# Altium integrated library CbyP.IntLib: 1144 symbols (part 4 of 6)
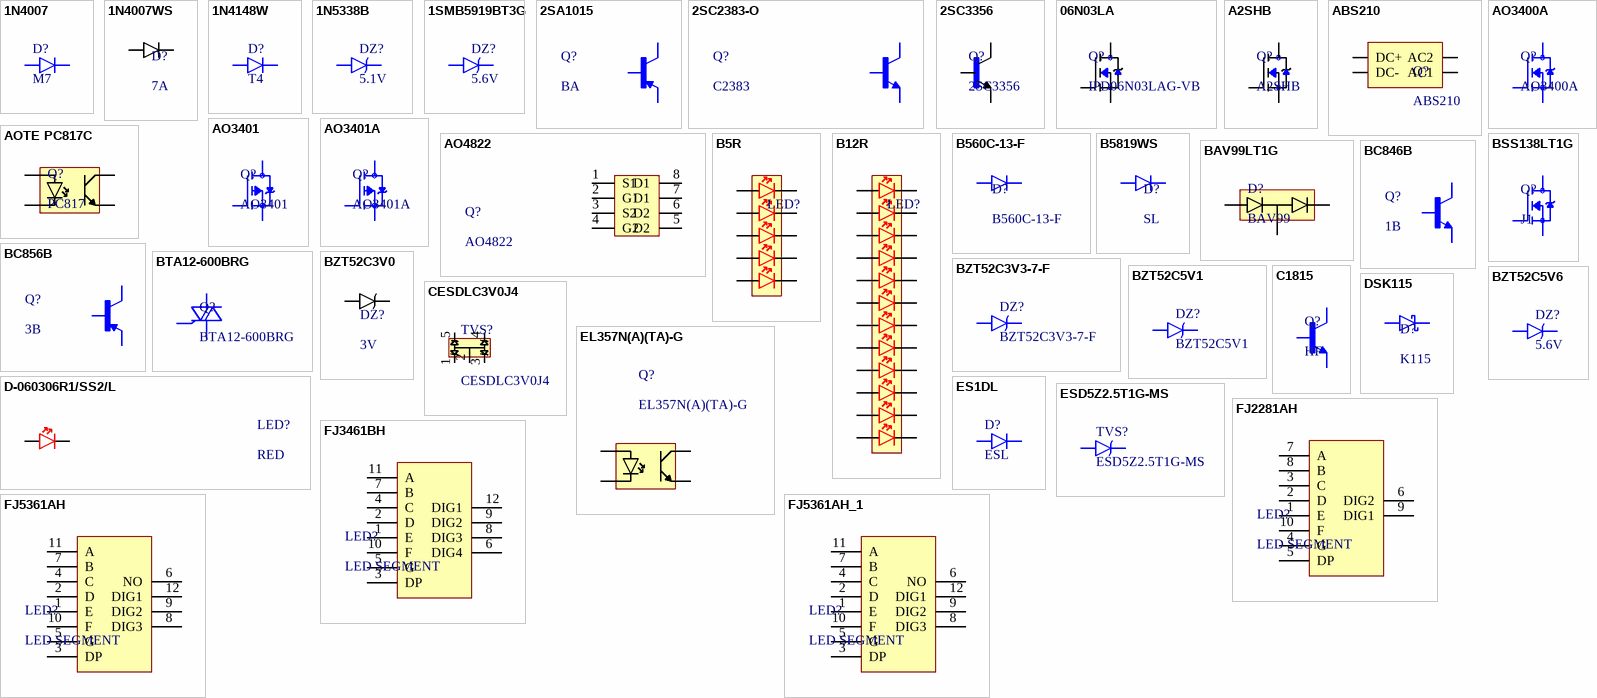
[diagram p44: symbols 1N4007 to FJ5361AH_1]

## 06N03LA
designator Q?, comment IPD06N03LAG-VB
20V 145A 3mΩ@4.5V 1PCSNChannel TO-252 MOSFETs ROHS; MF: Infineon Technologies; MP: IRF3205; SnapEDA_Link: https://www.snapeda.com/parts/IRF3205/Infineon+Technologies/view-part/?ref=snap; Package: TO-220 Infineon; Value: *; Check_prices: https://www.snapeda.com/parts/IRF3205/Infineon+Technologies/view-part/?ref=eda
footprint TO-252
pins: 1 G, 2 D, 3 S

## A2SHB
designator Q?
SOT-23 MOSFETs ROHS; Manufacturer: JSMSEMI; Mfr.Part #: JSM2302A-A2SHB; So_Chan_Dan: 3; So_Chan_Cam: 0; Package: SOT-23; Name: A2SHB
footprint SOT-23
pins: 1 G, 2 D, 3 S

## ABS210
designator Q?
Bridge Rectifier 1kV 2A Surface Mount ABS; Manufacturer: MDD(Microdiode Semiconductor); Package: ABS; Mfr.Part #: ABS210; LCSC Part #: C113925; DigiKey Part Number: 3372-ABS210TR-ND; ComponentLink1Description: Link; ComponentLink1URL: https://www.lcsc.com/product-detail/C113925.html; ComponentLink2Description: Link 1; ComponentLink2URL: https://www.digikey.com/en/products/detail/nextgen-components/ABS210/14632404
footprint ABS
pins: 1 DC+, 2 DC-, 3 AC1, 4 AC2

## AO3400A
designator Q?
N-Channel 30V 5.8A 1.4W Surface Mount SOT-23; Manufacturer: UMW; Package: SOT-23; Mfr.Part #: AO3400A; LCSC Part #: C347475
footprint SOT-23
pins: 1 G, 2 S, 3 D

## AO3401
designator Q?
P-Channel 30V 4.2A 350mW Surface Mount SOT-23; Manufacturer: TWGMC; Package: SOT-23; Mfr.Part #: AO3401; LCSC Part #: C727156; DigiKey Part Number: NO
footprint SOT-23
pins: 1 G, 2 S, 3 D

## AO3401A
designator Q?
P-Channel 30V 4.2A 1.4W Surface Mount SOT-23; Manufacturer: UMW; Package: SOT-23; Mfr.Part #: AO3401A; LCSC Part #: C347476; DigiKey Part Number: NO
footprint SOT-23
pins: 1 G, 2 S, 3 D

## AO4822
designator Q?
30V 8A 24mΩ@4.5V,8A 1.7W 1.9V 2 N-Channel SOP-8 MOSFETs ROHS; Manufacturer: JSMSEMI; Mfr.Part #: AO4822; LCSC Part #: C5183841; Package: SOP-8
footprint SOIC-8
pins: 1 S1, 2 G1, 3 S2, 4 G2, 5 D2, 6 D2, 7 D1, 8 D1

## AOTE PC817C
designator Q?, comment PC817
OPTOISOLATOR 5kV 1CH TRANS DIP-4; Manufacturer: AOTE; Mfr.Part #: PC817C; LCSC Part #: C20612594; Package: DIP-4
footprint DIP-4
pins: 1 A, 2 K, 3 E, 4 C

## B5R
designator LED?, comment RED  (value not drawn)
DIP-10 Circuit Board Indicators, Arrays, Light Bars, Bar Graphs RoHS; Manufacturer: NO; Mfr.Part #: NO; LCSC Part #: NO; Package: Through Hole,P=2.54mm; DigiKey Part Number: NO; ComponentLink1Description: Link; ComponentLink1URL: https://item.taobao.com/item.htm?abbucket=13&id=801005226731&mi_id=0000RSjy7MWG9MEzl0sTTXfjrQfMRvMpNq9WHekFtjHuldc&ns=1&priceTId=2100c80a17758733833458457e0cac&spm=a21n57.imgsearch.item.43&utparam=%7B%22aplus_abtest%22%3A%226d631dede6810eaf274afe32f180150b%22%7D&xxc=taobaoSearch&skuId=5681155402805
footprint b5r
pins: 1 A, 2 A, 3 A, 4 A, 5 A, 6 K, 7 K, 8 K, 9 K, 10 K

## B12R
designator LED?, comment RED  (value not drawn)
DIP-20 Circuit Board Indicators, Arrays, Light Bars, Bar Graphs RoHS; Manufacturer: NO; Mfr.Part #: NO; LCSC Part #: NO; Package: Through Hole,P=2.54mm; DigiKey Part Number: NO; ComponentLink1Description: Link; ComponentLink1URL: https://item.taobao.com/item.htm?abbucket=13&id=801005226731&mi_id=0000RSjy7MWG9MEzl0sTTXfjrQfMRvMpNq9WHekFtjHuldc&ns=1&priceTId=2100c80a17758733833458457e0cac&spm=a21n57.imgsearch.item.43&utparam=%7B%22aplus_abtest%22%3A%226d631dede6810eaf274afe32f180150b%22%7D&xxc=taobaoSearch&skuId=5681155402805
footprint B12R
pins: 1 A, 2 A, 3 A, 4 A, 5 A, 6 A, 7 A, 8 A, 9 A, 10 A, 11 A, 12 A, 13 K, 14 K, 15 K, 16 K, 17 K, 18 K, 19 K, 20 K, 21 K, 22 K, 23 K, 24 K

## B560C-13-F
designator D?
100A 1 Independent 60V 700mV@5A 5A SMC(DO-214AB) Single Diodes RoHS; Manufacturer: DIODES; Mfr.Part #: B560C-13-F; Package: SMC(DO-214AB); LCSC Part #: C85100; DigiKey Part Number: NO; ComponentLink1Description: Link; ComponentLink1URL: https://www.lcsc.com/product-detail/C85100.html?s_z=n_C85100; ComponentLink2Description: Link 1; ComponentLink2URL: https://www.digikey.com/en/products/detail/diodes-incorporated/B560C-13-F/768773
footprint SMC
pins: 1 A, 2 K

## B5819WS
designator D?, comment SL
25A 40V Independent 550mV@1A 1A SOD-323 Single Diodes RoHS; Manufacturer: GOODWORK; Mfr.Part #: B5819WS; Package: SOD-323; LCSC Part #: C6067464; DigiKey Part Number: NO
footprint SOD-323
pins: 1 A, 2 K

## BAV99LT1G
designator D?, comment BAV99
100V 1 pair in series 1.25V@150mA 6ns 215mA SOT-23 Switching Diodes ROHS; Manufacturer: onsemi; Mfr.Part #: BAV99LT1G; So_Chan_Dan: 2; So_Chan_Cam: 0; Package: SOT-23; Name: BAV99LT1G
footprint SOT-23
pins: 1 A, 2 C, 3 A/C

## BC846B
designator Q?, comment 1B
Bipolar (BJT) Transistor NPN 65V 0.1A 100MHz 200mW Surface Mount SOT-23; Manufacturer: UMW; Mfr.Part #: BC846B; LCSC Part #: C545560; Package: SOT-23
footprint SOT-23
pins: 1 B, 2 E, 3 C

## BC856B
designator Q?, comment 3B
Bipolar (BJT) Transistor PNP 65V 0.1A 100MHz 200mW Surface Mount SOT-23; Manufacturer: UMW; Mfr.Part #: BC856B; LCSC Part #: C545565C545565; Package: SOT-23
footprint SOT-23
pins: 1 B, 2 E, 3 C

## BSS138LT1G
designator Q?, comment J1
N-Channel 50V 200mA 225mW Surface Mount SOT-23; Manufacturer: onsemi; Mfr.Part #: BSS138LT1G; Package: SOT-23; LCSC Part #: C82045; DigiKey Part Number: BSS138LT1GOSTR-ND; ComponentLink1Description: Link; ComponentLink1URL: https://www.lcsc.com/product-detail/C82045.html?s_z=n_BSS138; ComponentLink2Description: Link 1; ComponentLink2URL: https://www.digikey.com/en/products/detail/onsemi/BSS138LT1G/918376?s=N4IgTCBcDaIEIGUEEYDMAOAMgFWQcRAF0BfIA
footprint SOT-23
pins: 1 G, 2 S, 3 D

## BTA12-600BRG
designator Q?
600V 12A Through Hole TO-220AB; Manufacturer: ST; Mfr.Part #: BTA12-600BRG; Package: TO-220AB; LCSC Part #: C10063; DigiKey Part Number: 497-2388-5-ND; ComponentLink1Description: Link; ComponentLink1URL: https://www.lcsc.com/product-detail/C10063.html?s_z=n_BTA12-600B; ComponentLink2Description: Link 1; ComponentLink2URL: https://www.digikey.com/en/products/detail/stmicroelectronics/BTA12-600BRG/603413
footprint TO-220
pins: 1 T1, 2 T2, 3 G

## BZT52C3V0
designator DZ?, comment 3V
Independent Type 2.8V~3.2V 500mW 3V SOD-123 Zener Diodes ROHS; Manufacturer: GOODWORK; Mfr.Part #: BZT52C3V0; Package: SOD-123
footprint SOD-123
pins: 1 A, 2 K

## BZT52C3V3-7-F
designator DZ?
Zener Diode Independent 3.3V 370mW Surface Mount SOD-123; Manufacturer: DIODES; Mfr.Part #: BZT52C3V3-7-F; Package: SOD-123; LCSC Part #: C151564; DigiKey Part Number: BZT52C3V3-FDITR-ND; ComponentLink1Description: Link; ComponentLink1URL: https://www.lcsc.com/product-detail/C151564.html; ComponentLink2Description: Link 1; ComponentLink2URL: https://www.digikey.com/en/products/detail/diodes-incorporated/BZT52C3V3-7-F/717734?s=N4IgTCBcDaIEIC0AqBWMBhAzANUwWgHY8AxEAXQF8g
footprint SOD-123
pins: 1 A, 2 K

## BZT52C5V1
designator DZ?
Independent Type 4.8V~5.4V 500mW 5.1V SOD-123 Zener Diodes ROHS; Manufacturer: MDD(Microdiode Semiconductor); So_Chan_Dan: 2; So_Chan_Cam: 0; Mfr.Part #: BZT52C5V1; Package: SOD-123; Name: BZT52C5V1
footprint SOD-123
pins: 1 A, 2 K

## BZT52C5V6
designator DZ?, comment 5.6V
Zener Diode Independent 5.6V 500mW Surface Mount SOD-123; Manufacturer: MDD(Microdiode Semiconductor); Mfr.Part #: BZT52C5V6; Package: SOD-123; LCSC Part #: C173406
footprint SOD-123
pins: 1 A, 2 K

## C1815
designator Q?, comment HF
Bipolar (BJT) Transistor NPN 50V 150mA 80MHz 200mW Surface Mount SOT-23; Manufacturer: Shikues; Mfr.Part #: C1815; Package: SOT-23; LCSC Part #: C123401; DigiKey Part Number: NO; ComponentLink1Description: Link; ComponentLink1URL: https://www.lcsc.com/product-detail/C123401.html?s_z=n_C123401; ComponentLink2Description: Link 1
footprint SOT-23
pins: 1 B, 2 E, 3 C

## CESDLC3V0J4
designator TVS?
2.5A 8V 5.3V Unidirectional 3V SOT-353 ESD and Surge Protection (TVS/ESD) ROHS; Manufacturer: Jiangsu Changjing Electronics Technology Co., Ltd.; So_Chan_Dan: 5; So_Chan_Cam: 0; Mfr.Part #: CESDLC3V0J4; Package: SOD-323; Name: CESDLC3V0J4
footprint SOT-353
pins: 1 C, 2 A, 3 C, 4 C, 5 C

## D-060306R1/SS2/L
designator LED?, comment RED
Red 0603 LED Indication - Discrete ROHS; Manufacturer: ARKLED(Wuxi ARK Tech Elec); Mfr.Part #: D-060306R1/SS2/L; Package: 0603; LCSC Part #: C118330; DigiKey Part Number: NO
footprint LED-0603
pins: 1 A, 2 K

## DSK115
designator D?, comment K115
DIODE SCHOTTKY 150V SOD-123FL; Manufacturer: R+O; Mfr.Part #: DSK115; Package: SOD-123FL; LCSC Part #: C28646287
footprint SOD-123
pins: 1 A, 2 K

## EL357N(A)(TA)-G
designator Q?
4 Pin SOP Phototransistor Photocoupler; Manufacturer: EVERLIGHT; Package: SOP-4-2.54mm; Mfr.Part #: EL357N(A)(TA)-G; LCSC Part #: C42385000
footprint SOP-4-2.54mm
pins: 1 A, 2 K, 3 E, 4 C

## ES1DL
designator D?, comment ESL
Diode 200V 1A SOD-123FL; Manufacturer: JSCJ; Mfr.Part #: ES1DL; Package: SOD-123FL; LCSC Part #: C2923901
footprint SOD-123
pins: 1 A, 2 K

## ESD5Z2.5T1G-MS
designator TVS?
10.9VC Clamp 11A Ipp ESD DIODE SOD-523; Manufacturer: MSKSEMI; Mfr.Part #: ESD5Z2.5T1G-MS; Package: SOD-523; LCSC Part #: C3008118; DigiKey Part Number: NO; ComponentLink1Description: Link; ComponentLink1URL: https://www.lcsc.com/product-detail/C3008118.html?s_z=n_ESD5Z2.5T1G-MS
footprint SOD-523
pins: 1 A, 2 K

## FJ2281AH
designator LED?, comment LED SEGMENT
Display Modules - LED Character and Numeric Red 2 Character Common Cathode Through Hole; Manufacturer: ZHIHAO; Mfr.Part #: FJ2281AH; Package: Through Hole; LCSC Part #: C10693; DigiKey Part Number: NO; ComponentLink1Description: Link; ComponentLink1URL: https://www.lcsc.com/product-detail/C10693.html; ComponentLink2Description: Link
footprint LED SEGMENT 2 POSITIONS 0.28INCH
pins: 1 E, 2 D, 3 C, 4 G, 5 DP, 6 DIG2, 7 A, 8 B, 9 DIG1, 10 F

## FJ3461BH
designator LED?, comment LED SEGMENT
Display Modules - LED Character and Numeric Red 4 Character Common Anode Through Hole,DISPLAY 0.36" QUAD RED TH; Manufacturer: ZHIHAO; Mfr.Part #: FJ3461BH; Package: Through Hole; LCSC Part #: C10711; DigiKey Part Number: NO; ComponentLink1Description: Link; ComponentLink1URL: https://www.lcsc.com/product-detail/C10711.html?s_z=n_FJ3461BH
footprint LED_7_THANH_4_SO_0.36_INCH - 1
pins: 1 E, 2 D, 3 DP, 4 C, 5 G, 6 DIG4, 7 B, 8 DIG3, 9 DIG2, 10 F, 11 A, 12 DIG1

## FJ5361AH
designator LED?, comment LED SEGMENT
Display Modules - LED Character and Numeric Red 3 Character Common Cathode Through Hole; Manufacturer: ZHIHAO; Mfr.Part #: FJ5361AH; Package: Through Hole; LCSC Part #: C18187; DigiKey Part Number: NO; ComponentLink1Description: Link; ComponentLink1URL: https://www.lcsc.com/product-detail/C18187.html; ComponentLink2Description: Link
footprint LED SEGMENT 3 POSITIONS 0.56INCH
pins: 1 E, 2 D, 3 DP, 4 C, 5 G, 6 NO, 7 B, 8 DIG3, 9 DIG2, 10 F, 11 A, 12 DIG1

## FJ5361AH_1
designator LED?, comment LED SEGMENT
Display Modules - LED Character and Numeric Red 3 Character Common Cathode Through Hole; Manufacturer: ZHIHAO; Mfr.Part #: FJ5361AH; Package: Through Hole; LCSC Part #: C18187; DigiKey Part Number: NO; ComponentLink1Description: Link; ComponentLink1URL: https://www.lcsc.com/product-detail/C18187.html; ComponentLink2Description: Link
footprint LED SEGMENT 3 POSITIONS 0.56INCH
pins: 1 E, 2 D, 3 DP, 4 C, 5 G, 6 NO, 7 B, 8 DIG3, 9 DIG2, 10 F, 11 A, 12 DIG1

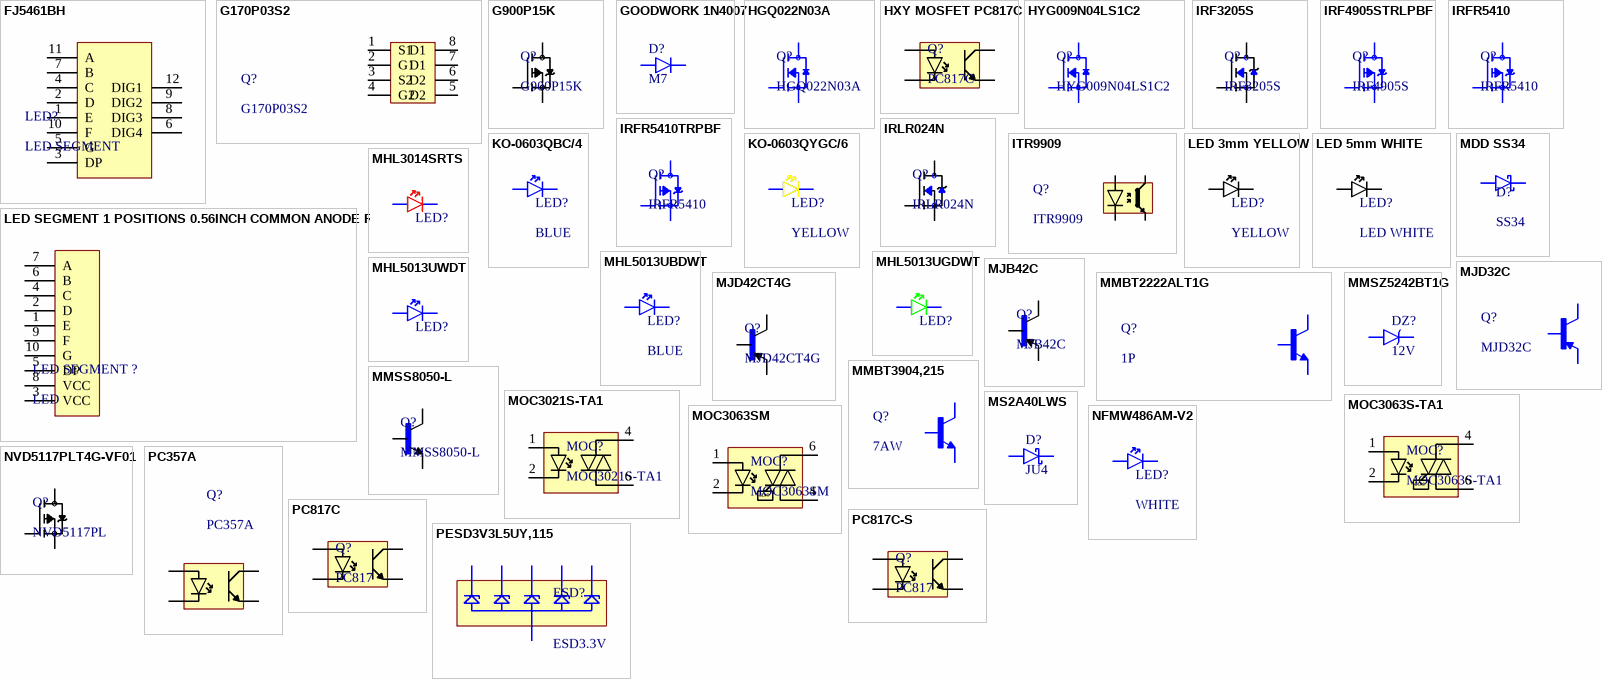
[diagram p20: symbols FJ5461BH to PESD3V3L5UY,115]

## FJ5461BH
designator LED?, comment LED SEGMENT
Display Modules - LED Character and Numeric Red 4 Character Common Anode Through Hole; Manufacturer: ZHIHAO; Mfr.Part #: FJ5461BH; Package: Through Hole; LCSC Part #: C10713; DigiKey Part Number: NO
footprint LED SEGMENT 4 POSITIONS 0.56INCH
pins: 1 E, 2 D, 3 DP, 4 C, 5 G, 6 DIG4, 7 B, 8 DIG3, 9 DIG2, 10 F, 11 A, 12 DIG1

## G170P03S2
designator Q?
30V 9A 25mΩ@5A,4.5V 1.4W 2.5V@250uA 2 P-Channel SOP-8 MOSFETs ROHS; Manufacturer: GOFORD; So_Chan_Dan: 6; So_Chan_Cam: 0; Mfr.Part #: G170P03S2; Name: G170P03S2; Package: SOP-8
footprint SOIC-8
pins: 1 S1, 2 G1, 3 S2, 4 G2, 5 D2, 6 D2, 7 D1, 8 D1

## G900P15K
designator Q?
P-Channel 150 V 35A (Tc) 198W (Tc) Surface Mount TO-252; Manufacturer: Goford Semiconductor; Package: TO-252; Mfr.Part #: G900P15K; DigiKey Part Number: 3141-G900P15KTR-ND
footprint TO-252
pins: 1 G, 2 D, 3 S

## GOODWORK 1N4007
designator D?, comment M7
DIODE STANDARD 1kV 1A DO-41; Manufacturer: GOODWORK; Mfr.Part #: 1N4007; Package: DO-41; LCSC Part #: C2985028
footprint DO-41
pins: 1 A, 2 K

## HGQ022N03A
designator Q?
N-Channel 30V 140A 78W SOP-8-Advance; Manufacturer: NO; Package: PDFN5060-8L; Mfr.Part #: HGQ022N03A; LCSC Part #: NO; DigiKey Part Number: NO; ComponentLink1Description: Link; ComponentLink1URL: https://item.taobao.com/item.htm?abbucket=13&id=978269002974&mi_id=0000eZge_bPbjx6qxo1yCiedIqhlSuS-hlt-FxQslH3dLrU&ns=1&priceTId=2100c82a17759727700605459e0d04&spm=a21n57.1.hoverItem.2&utparam=%7B%22aplus_abtest%22%3A%228e7b508443bde03f9c587263872f60b6%22%7D&xxc=taobaoSearch; ComponentLink2Description: Link 1; ComponentLink2URL: https://www.crmicro.com/MOSFET02/2023-08-14/P020220720517237971215.pdf
footprint PDFN5060-8L-1.1MM
pins: 1 S, 2 S, 3 S, 4 G, 5_8 D

## HXY MOSFET PC817C
designator Q?, comment PC817C
Phototransistor Output 5kVrms 1 Channel SMD-4P; Manufacturer: HXY MOSFET; Mfr.Part #: PC817C; LCSC Part #: C5451663; Package: SMD-4P; DigiKey Part Number: NO; ComponentLink1Description: Link; ComponentLink1URL: https://www.lcsc.com/product-detail/C5451663.html?s_z=n_c5451663; ComponentLink2Description: Link 1
footprint SOP-4
pins: 1 A, 2 K, 3 E, 4 C

## HYG009N04LS1C2
designator Q?
N-Channel 40V 200A 75W Surface Mount PDFN5x6-8L; Manufacturer: HUAYI; Package: PDFN5x6-8L; Mfr.Part #: HYG009N04LS1C2; LCSC Part #: C2890387; DigiKey Part Number: NO; ComponentLink1Description: Link; ComponentLink1URL: https://www.lcsc.com/product-detail/C2890387.html; ComponentLink2Description: Link 1
footprint PDFN5060-8L-1.1MM
pins: 1 S, 2 S, 3 S, 4 G, 5_8 D

## IRF3205S
designator Q?
TO-263 MOSFETs ROHS; Manufacturer: JSMSEMI; So_Chan_Dan: 3; So_Chan_Cam: 0; Mfr.Part #: IRF3205S; Package: TO-263; Name: IRF3205S
footprint TO-263
pins: 1 G, 2 D, 3 S

## IRF4905STRLPBF
designator Q?, comment IRF4905S
P-Channel 55V 70A 170W Surface Mount D2PAK; Manufacturer: Infineon; Mfr.Part #: IRF4905STRLPBF; Package: D2PAK; LCSC Part #: C2620; DigiKey Part Number: IRF4905STRLPBFTR-ND; ComponentLink1Description: Link; ComponentLink1URL: https://www.lcsc.com/product-detail/C2620.html?s_z=n_IRF4905S; ComponentLink2Description: Link 1; ComponentLink2URL: https://www.digikey.com/en/products/detail/infineon-technologies/IRF4905STRLPBF/1928283?s=N4IgTCBcDaIJICUBiAWAnABgKwGUAqCAMgAoBCSIAugL5A
footprint TO-263
pins: 1 G, 2 D, 3 S

## IRFR5410
designator Q?
100V 13A Surface Mount TO-252; Manufacturer: TECH PUBLIC; Package: TO-252; Mfr.Part #: IRFR5410; LCSC Part #: C5342377; DigiKey Part Number: NO; ComponentLink1Description: Link; ComponentLink1URL: https://www.lcsc.com/product-detail/C5342377.html?s_z=n_IRF5410; ComponentLink2Description: Link 1
footprint TO-252
pins: 1 G, 2 D, 3 S

## IRFR5410TRPBF
designator Q?, comment IRFR5410
P-Channel 100V 13A 66W Surface Mount DPAK(TO-252AA); Manufacturer: Infineon; Mfr.Part #: IRFR5410TRPBF; Package: DPAK(TO-252AA); LCSC Part #: C3018; DigiKey Part Number: IRFR5410PBFTR-ND; ComponentLink1Description: Link; ComponentLink1URL: https://www.lcsc.com/product-detail/C3018.html?s_z=n_C3018; ComponentLink2Description: Link 1; ComponentLink2URL: https://www.digikey.com/en/products/detail/infineon-technologies/IRFR5410TRPBF/812646?s=N4IgTCBcDaIJICUBiCCsAWAjABgCoIAUAhJEAXQF8g
footprint TO-252
pins: 1 G, 2 D, 3 S

## IRLR024N
designator Q?
55V 17A 45W 65mΩ@10V,10A 2V@250uA 1PCSNChannel TO-252-2(DPAK) MOSFETs ROHS; Manufacturer: Infineon Technologies; Mfr.Part #: IRLR024NTRPBF; So_Chan_Dan: 3; So_Chan_Cam: 0; Package: TO-252-2(DPAK); Name: IRLR024N
footprint TO-252
pins: 1 G, 2 D, 3 S

## ITR9909
designator Q?
Reflective Optical Interrupters ROHS; Manufacturer: XINGLIGHT; Mfr.Part #: XL-ITR9909; So_Chan_Dan: 0; So_Chan_Cam: 4; Name: ITR9909; Package: Plugin
footprint ITR9909
pins: 1 K, 2 A, 3 E, 4 C

## KO-0603QBC/4
designator LED?, comment BLUE
0603 BLUE; Manufacturer: NO; Mfr.Part #: KO-0603QBC/4; Package: 0603; LCSC Part #: NO; DigiKey Part Number: NO; ComponentLink1Description: Link; ComponentLink2Description: Link 1
footprint LED-0603
pins: 1 A, 2 K

## KO-0603QYGC/6
designator LED?, comment YELLOW
0603 YELLOW; Manufacturer: NO; Mfr.Part #: KO-0603QYGC/6; Package: 0603; LCSC Part #: NO; DigiKey Part Number: NO; ComponentLink1Description: Link; ComponentLink2Description: Link 1
footprint LED-0603
pins: 1 A, 2 K

## LED 3mm YELLOW
designator LED?, comment YELLOW
20mA Yellow lens -20℃~+75℃ 590nm~595nm Yellow 30° 3mm round bulb 60mW Plugin,D=3mm LED Indication - Discrete ROHS; Manufacturer: TUOZHAN; Mfr.Part #: TZ-L2-03YYBY2YDJ30-001; Name: LED 3mm YELLOW; So_Chan_Dan: 0; So_Chan_Cam: 2; Package: Plugin,D=3mm
footprint LED-3MM-YELLOW
pins: 1 A, 2 K

## LED 5mm WHITE
designator LED?, comment LED WHITE
20mA Colorless transparent lens -40℃~+85℃ White 15° 5mm round lamp head 100mW Plugin,D=5mm LED Indication - Discrete ROHS; Manufacturer: Everlight Elec; Mfr.Part #: 333-2UTC/S400-A6; Name: LED 5mm WHITE; So_Chan_Dan: 0; So_Chan_Cam: 2; Package: Plugin,D=5mm
footprint LED-5MM-WHITE
pins: 1 A, 2 K

## LED SEGMENT 1 POSITIONS 0.56INCH COMMON ANODE RED
designator LED SEGMENT ?, comment LED
Red 1 Digit Common Anode 0.56 Plugin LED Segment Displays ROHS; Manufacturer: Shenzhen Zhihao Elec; Mfr.Part #: FJ5161BH; Name: LED SEGMENT 1 POSITIONS 0.56INCH COMMON ANODE RED; So_Chan_Dan: 0; So_Chan_Cam: 10; Package: Plugin
footprint LED SEGMENT 1POSITIONS 0.56INCH
pins: 1 E, 2 D, 3 VCC, 4 C, 5 DP, 6 B, 7 A, 8 VCC, 9 F, 10 G

## MDD SS34
designator D?, comment SS34
Diode Independent 40V 3A Surface Mount SMA(DO-214AC); Manufacturer: MDD(Microdiode Semiconductor); Mfr.Part #: SS34; Package: SMA(DO-214AC); LCSC Part #: C8678
footprint SMA(DO-214AC)
footprint SMA(DO-214AC) - 2
pins: 1 A, 2 K

## MHL3014SRTS
designator LED?, comment RED  (value not drawn)
Red 660nm LED Indication - Discrete 1.8V Through Hole,D=3mm; Manufacturer: XINGLIGHT; Mfr.Part #: MHL3014SRTS; LCSC Part #: C397053; Package: Through Hole,D=3mm; DigiKey Part Number: NO
footprint LED-3MM-RED
pins: 1 A, 2 K

## MHL5013UBDWT
designator LED?, comment BLUE
20mA Colorless Transparent Lens 468nm -25℃~+85℃ Blue 30° 5mm round lamp head 120mW Plugin,D=5mm LED Indication - Discrete ROHS; Manufacturer: MEIHUA; Mfr.Part #: MHL5013UBDWT; LCSC Part #: C559114; Package: Through Hole,D=5mm
footprint LED-5MM-BLUE
pins: 1 A, 2 K

## MHL5013UGDWT
designator LED?, comment GREEN  (value not drawn)
Emerald Green 525nm LED Indication - Discrete 3.2V Through Hole,D=5mm; Manufacturer: MEIHUA; Mfr.Part #: MHL5013UGDWT; LCSC Part #: C417346; Package: Through Hole,D=5mm; DigiKey Part Number: NO; ComponentLink1Description: Link; ComponentLink1URL: https://www.lcsc.com/product-detail/C417346.html?s_z=n_MHL5013UGDWT; ComponentLink2Description: Link 1
footprint LED-5MM-GREEN
pins: 1 A, 2 K

## MHL5013UWDT
designator LED?, comment WHITE  (value not drawn)
White LED Indication - Discrete 3.2V Through Hole,D=5mm; Manufacturer: MEIHUA; Mfr.Part #: MHL5013UWDT; LCSC Part #: C559115; Package: Through Hole,D=5mm; DigiKey Part Number: NO; ComponentLink1Description: Link; ComponentLink1URL: https://www.lcsc.com/product-detail/C559115.html
footprint LED-5MM-WHITE
pins: 1 A, 2 K

## MJB42C
designator Q?
100V 2W 15@3A,4V 6A PNP TO-263-2 Bipolar (BJT) ROHS; Manufacturer: onsemi; Mfr.Part #: MJB42CT4G; So_Chan_Dan: 3; So_Chan_Cam: 0; Name: MJB42C; Package: TO-263-2
footprint TO-263
pins: 1 B, 2 C, 3 E

## MJD32C
designator Q?
TRANS PNP 100V 3A TO-252-2L; Manufacturer: JSCJ; Mfr.Part #: MJD32C; LCSC Part #: C40241; Package: TO-252-2L
footprint TO-252
pins: 1 B, 2 C, 3 E

## MJD42CT4G
designator Q?
100V 6A PNP TO-252 Bipolar (BJT) ROHS; Manufacturer: MSKSEMI; So_Chan_Dan: 3; So_Chan_Cam: 0; Mfr.Part #: MJD42CT4G; Name: MJD42CT4G; Package: TO-252
footprint TO-252
pins: 1 B, 2 C, 3 E

## MMBT2222ALT1G
designator Q?, comment 1P
Bipolar (BJT) Transistor NPN 40V 600mA 225mW Surface Mount SOT-23; Manufacturer: onsemi; Mfr.Part #: MMBT2222ALT1G; LCSC Part #: C82460; Package: SOT-23; DigiKey Part Number: MMBT2222ALT1GOSTR-ND; ComponentLink1Description: Link; ComponentLink1URL: https://www.lcsc.com/product-detail/C82460.html?s_z=n_mmbt; ComponentLink2Description: Link 1; ComponentLink2URL: https://www.digikey.com/en/products/detail/onsemi/MMBT2222ALT1G/919593
footprint SOT-23
pins: 1 B, 2 E, 3 C

## MMBT3904,215
designator Q?, comment 7AW
Bipolar (BJT) Transistor NPN 40V 200mA 300MHz 250mW Surface Mount SOT-23; Manufacturer: Nexperia; Mfr.Part #: MMBT3904,215; LCSC Part #: C426835; DigiKey Part Number: 1727-4044-2-ND; Package: SOT-23
footprint SOT-23
pins: 1 B, 2 E, 3 C

## MMSS8050-L
designator Q?
25V 625mW 120@100mA,1V 1.5A NPN SOT-23 Bipolar (BJT) ROHS; Manufacturer: MCC(Micro Commercial Components); Mfr.Part #: MMSS8050-L-TP; So_Chan_Dan: 3; So_Chan_Cam: 0; Name: MMSS8050-L; Package: SOT-23
footprint SOT-23
pins: 1 B, 2 E, 3 C

## MMSZ5242BT1G
designator DZ?, comment 12V
Zener Diode Independent 12V 500mW Surface Mount SOD-123; Manufacturer: onsemi; Mfr.Part #: MMSZ5242BT1G; Package: SOD-123; LCSC Part #: C82050; DigiKey Part Number: MMSZ5242BT1GOSTR-ND; ComponentLink1Description: Link; ComponentLink1URL: https://www.lcsc.com/product-detail/C82050.html; ComponentLink2Description: Link 1; ComponentLink2URL: https://www.digikey.com/en/products/detail/onsemi/MMSZ5242BT1G/919759
footprint SOD-123
pins: 1 A, 2 K

## MOC3021S-TA1
designator MOC?
1000V/us 50mA 1.15V 400V SMD-6P Triac, SCR Output Optoisolators RoHS; Manufacturer: LITEON; Mfr.Part #: MOC3021S-TA1; Package: SMD-6P; LCSC Part #: C115465; DigiKey Part Number: 160-2045-2-ND; ComponentLink1Description: Link; ComponentLink1URL: https://www.lcsc.com/product-detail/C115465.html?s_z=n_MOC3021S-TA1; ComponentLink2Description: Link 1; ComponentLink2URL: https://www.digikey.com/en/products/detail/liteon/MOC3021S-TA1/388489?s=N4IgTCBcDaILIHkDCBmADGAjAZQLQBUBBTEAXQF8g
footprint SMD-6P
pins: 1 ANODE, 2 CATHODE, 4 MAIN_TERMINAL1, 6 MAIN_TERMINAL2
